# Altium footprint library 430 integreted.PcbLib: 281 footprints (part 10 of 18)
Each footprint in its own frame and in the unit in brackets; x right, y up, seen from the top. Pads: shape width x height; smd on the part's side, far side on the other; paste and mask are expansions set on the pad; w line width, h text height; cw(c..) or ccw(c..) is an arc to the next point about the centre after c.
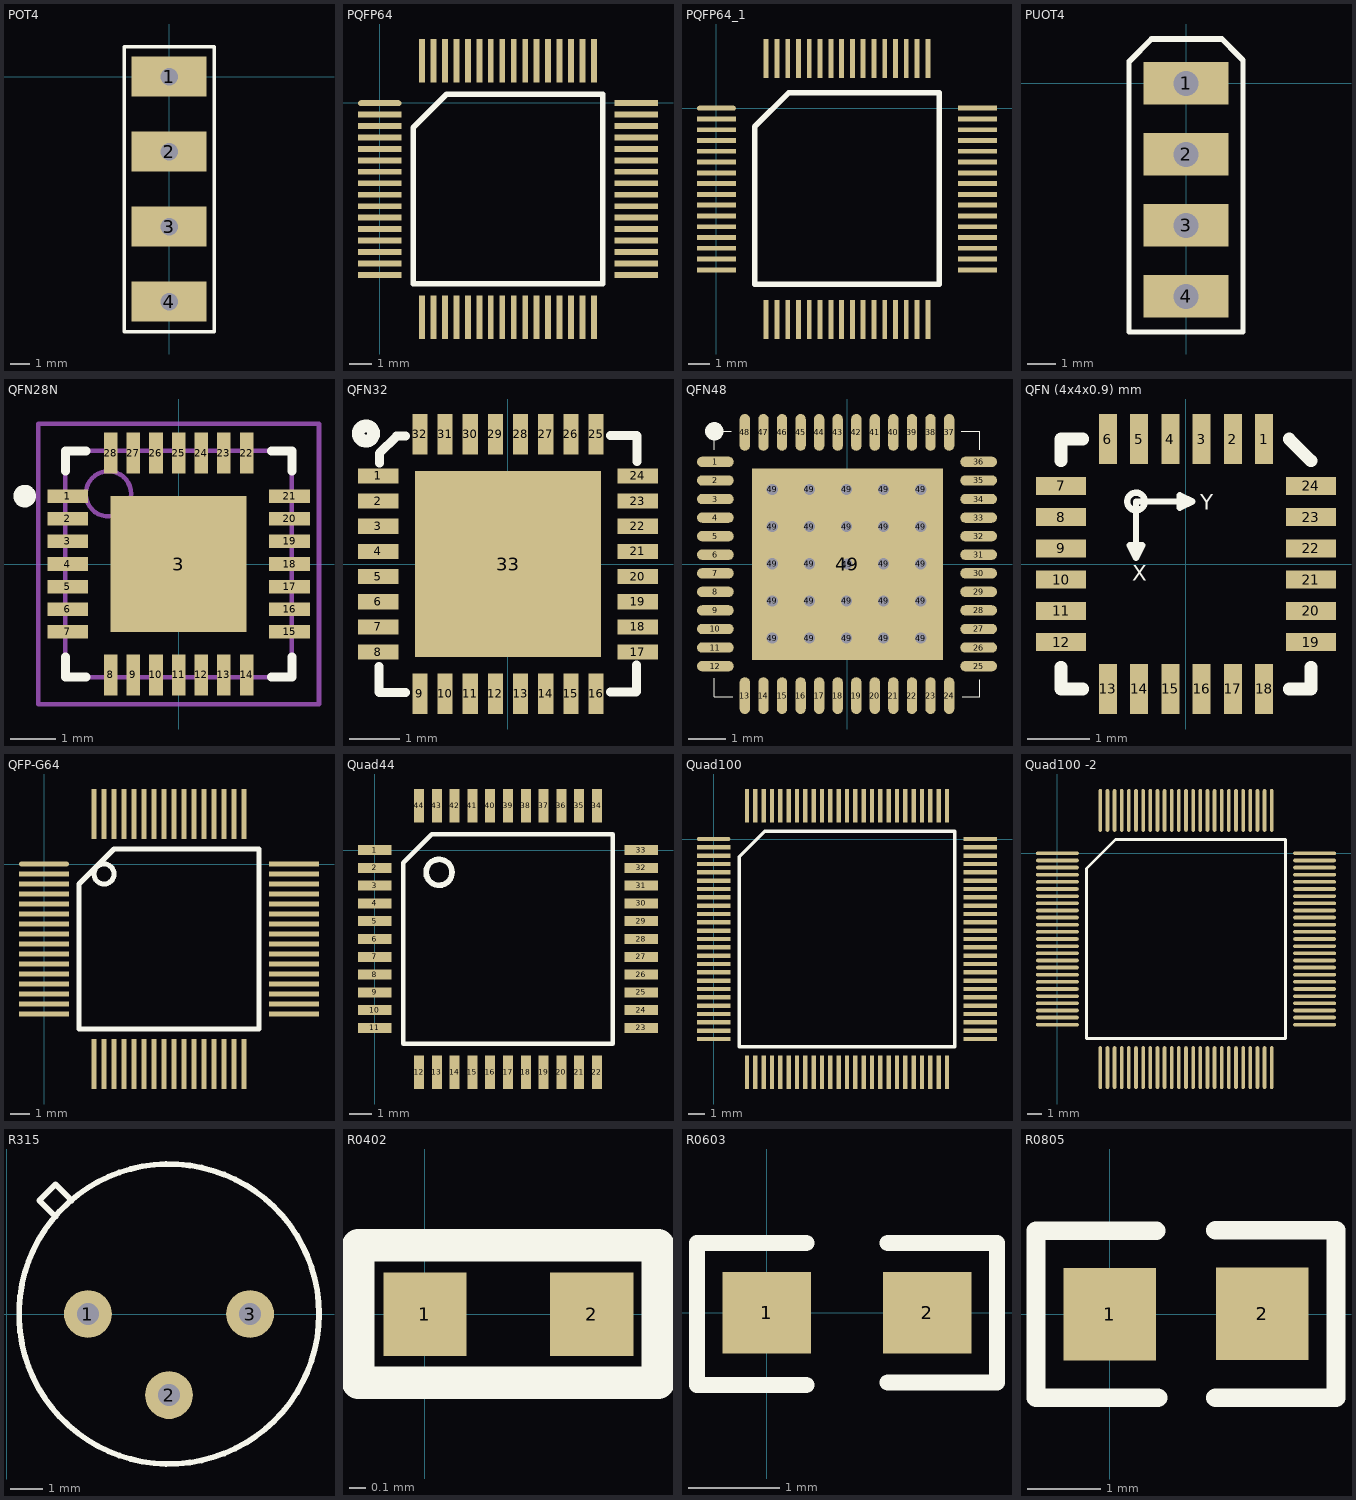
[diagram p9: the footprints below, top view; thin cyan lines are the x and y axes]

## POT4 [mil]
pads (4):
  rect 150x80 hole 35: 1(0,0) 2(0,-150) 3(0,-300) 4(0,-450)
Top Overlay:
  lines w7: -90,-510 -90,60 90,60 90,-510 -90,-510

## PQFP64 [mil]
pads (64):
  oval 74.8x10 smd: 1(-0.07,-0.43)
  rect 74.8x10 smd: 2(-0.07,-20.12) 3(-0.07,-39.8) 4(-0.07,-59.49) 5(-0.07,-79.17) 6(-0.07,-98.86) 7(-0.07,-118.54) 8(-0.07,-138.23) 9(-0.07,-157.91) 10(-0.07,-177.6) 11(-0.07,-197.28) 12(-0.07,-216.97) 13(-0.07,-236.65) 14(-0.07,-256.34) 15(-0.07,-276.02) 16(-0.07,-295.71) 33(440.87,-295.71) 34(440.87,-276.02) 35(440.87,-256.34) 36(440.87,-236.65) 37(440.87,-216.97) 38(440.87,-197.28) 39(440.87,-177.6) 40(440.87,-157.91) 41(440.87,-138.23) 42(440.87,-118.54) 43(440.87,-98.86) 44(440.87,-79.17) 45(440.87,-59.49) 46(440.87,-39.8) 47(440.87,-20.12) 48(440.87,-0.43)
  rect 10x74.8 smd: 17(72.76,-368.54) 18(92.45,-368.54) 19(112.13,-368.54) 20(131.82,-368.54) 21(151.5,-368.54) 22(171.19,-368.54) 23(190.87,-368.54) 24(210.56,-368.54) 25(230.24,-368.54) 26(249.93,-368.54) 27(269.61,-368.54) 28(289.3,-368.54) 29(308.98,-368.54) 30(328.67,-368.54) 31(348.35,-368.54) 32(368.04,-368.54) 49(368.04,72.4) 50(348.35,72.4) 51(328.67,72.4) 52(308.98,72.4) 53(289.3,72.4) 54(269.61,72.4) 55(249.93,72.4) 56(230.24,72.4) 57(210.56,72.4) 58(190.87,72.4) 59(171.19,72.4) 60(151.5,72.4) 61(131.82,72.4) 62(112.13,72.4) 63(92.45,72.4) 64(72.76,72.4)
Top Overlay:
  lines w9.84: 57.41,-311.06 57.41,-42.56 114.89,14.92 383.39,14.92 383.39,-311.06 57.41,-311.06

## PQFP64_1 [mil]
pads (64):
  oval 71x9 smd: 1(0,0)
  rect 71x9 smd: 2(0,-19.68) 3(0,-39.37) 4(0,-59.05) 5(0,-78.74) 6(0,-98.42) 7(0,-118.11) 8(0,-137.79) 9(0,-157.48) 10(0,-177.16) 11(0,-196.85) 12(0,-216.54) 13(0,-236.22) 14(0,-255.91) 15(0,-275.59) 16(0,-295.28) 33(477.01,-295.28) 34(477.01,-275.59) 35(477.01,-255.91) 36(477.01,-236.22) 37(477.01,-216.54) 38(477.01,-196.85) 39(477.01,-177.16) 40(477.01,-157.48) 41(477.01,-137.79) 42(477.01,-118.11) 43(477.01,-98.42) 44(477.01,-78.74) 45(477.01,-59.05) 46(477.01,-39.37) 47(477.01,-19.68) 48(477.01,0)
  rect 9x71 smd: 17(90.87,-386.14) 18(110.55,-386.14) 19(130.24,-386.14) 20(149.92,-386.14) 21(169.61,-386.14) 22(189.29,-386.14) 23(208.98,-386.14) 24(228.66,-386.14) 25(248.35,-386.14) 26(268.03,-386.14) 27(287.72,-386.14) 28(307.4,-386.14) 29(327.09,-386.14) 30(346.77,-386.14) 31(366.46,-386.14) 32(386.14,-386.14) 49(386.14,90.87) 50(366.46,90.87) 51(346.77,90.87) 52(327.09,90.87) 53(307.4,90.87) 54(287.72,90.87) 55(268.03,90.87) 56(248.35,90.87) 57(228.66,90.87) 58(208.98,90.87) 59(189.29,90.87) 60(169.61,90.87) 61(149.92,90.87) 62(130.24,90.87) 63(110.55,90.87) 64(90.87,90.87)
Top Overlay:
  lines w10: 70,-321.85 407.01,-321.85 407.01,28.15 132.01,28.15 70,-33.86 70,-321.85

## PUOT4 [mil]
pads (4):
  rect 120x60 hole 35: 1(0,0) 2(0,-100) 3(0,-200) 4(0,-300)
Top Overlay:
  lines w7: -80,31 -80,-350 80,-350 80,33
  lines w8: -80,31 -48.5,62.5 50.5,62.5 72.62,40.38 80,33

## QFN28N [mm] "QFN, 28-Leads, Body 5.0x5.0mm (max), Pitch 0.50mm, IPC Medium Density"
height 0.8
pads (37):
  rect 0.9x0.3 smd: 1(-2.45,1.5) 2(-2.45,1) 3(-2.45,0.5) 4(-2.45,0) 5(-2.45,-0.5) 6(-2.45,-1) 7(-2.45,-1.5) 15(2.45,-1.5) 16(2.45,-1) 17(2.45,-0.5) 18(2.45,0) 19(2.45,0.5) 20(2.45,1) 21(2.45,1.5)
  rect 3x3 smd: 3(0,0)
  rect 0.3x0.9 smd: 8(-1.5,-2.45) 9(-1,-2.45) 10(-0.5,-2.45) 11(0,-2.45) 12(0.5,-2.45) 13(1,-2.45) 14(1.5,-2.45) 22(1.5,2.45) 23(1,2.45) 24(0.5,2.45) 25(0,2.45) 26(-0.5,2.45) 27(-1,2.45) 28(-1.5,2.45)
  rect 0x0 smd: 29(-0.85,0) 30(-0.35,0) 31(0,0.85) 32(0,0.35) 33(0.85,0) 34(0.35,0) 35(0,-0.85) 36(0,-0.35)
Top Overlay:
  circle w0.25: c-3.4,1.5 r0.125
  lines w0.2: -2.5,-2.05 -2.5,-2.5 -2.05,-2.5 ; -2.5,2.05 -2.5,2.5 -2.05,2.5 ; 2.05,-2.5 2.5,-2.5 2.5,-2.05 ; 2.05,2.5 2.5,2.5 2.5,2.05
Mechanical 13:
  circle w0.1: c-1.55,1.55 r0.5
  lines w0.1: -2.5,-2.5 2.5,-2.5 2.5,2.5 -2.5,2.5 -2.5,-2.5
Mechanical 15:
  lines w0.1: -0.5,0 0.5,0 ; 0,-0.5 0,0.5 ; -3.1,-3.1 3.1,-3.1 3.1,3.1 -3.1,3.1 -3.1,-3.1
3D body: height 0.8, standoff 0.02, extent -2.5,-2.5 2.5,2.5

## QFN32 [mm]
pads (33):
  rect 0.8x0.3 smd: 1(-2.578,1.751) 2(-2.578,1.25) 3(-2.578,0.75) 4(-2.578,0.25) 5(-2.578,-0.25) 6(-2.578,-0.75) 7(-2.578,-1.25) 8(-2.578,-1.75) 17(2.578,-1.75) 18(2.578,-1.25) 19(2.578,-0.75) 20(2.578,-0.25) 21(2.578,0.25) 22(2.578,0.75) 23(2.578,1.25) 24(2.578,1.75)
  rect 0.3x0.8 smd: 9(-1.75,-2.578) 10(-1.25,-2.578) 11(-0.75,-2.578) 12(-0.25,-2.578) 13(0.25,-2.578) 14(0.75,-2.578) 15(1.25,-2.578) 16(1.75,-2.578) 25(1.75,2.578) 26(1.25,2.578) 27(0.75,2.578) 28(0.25,2.578) 29(-0.25,2.578) 30(-0.75,2.578) 31(-1.25,2.578) 32(-1.75,2.578)
  rect 3.7x3.7 smd: 33(0,0)
Top Overlay:
  circle w0.254: c-2.819,2.591 r0.152
  lines w0.178: -2.565,-2.032 -2.565,-2.54 -2.553,-2.553 -2.032,-2.553 ; -2.553,2.007 -2.553,2.197 -2.21,2.54 -2.032,2.54 ; 2.032,-2.54 2.54,-2.54 2.553,-2.527 2.553,-2.007 ; 2.032,2.553 2.553,2.553 2.565,2.54 2.565,2.032
3D body: height 0.8, standoff 0, extent -2.494,-2.51 2.526,2.51

## QFN48 [mm]
pads (74):
  oval 0.99x0.28 smd: 1(-3.545,2.75) 2(-3.545,2.25) 3(-3.545,1.75) 4(-3.545,1.25) 5(-3.545,0.75) 6(-3.545,0.25) 7(-3.545,-0.25) 8(-3.545,-0.75) 9(-3.545,-1.25) 10(-3.545,-1.75) 11(-3.545,-2.25) 12(-3.545,-2.75) 25(3.545,-2.75) 26(3.545,-2.25) 27(3.545,-1.75) 28(3.545,-1.25) 29(3.545,-0.75) 30(3.545,-0.25) 31(3.545,0.25) 32(3.545,0.75) 33(3.545,1.25) 34(3.545,1.75) 35(3.545,2.25) 36(3.545,2.75)
  oval 0.28x0.99 smd: 13(-2.75,-3.545) 14(-2.25,-3.545) 15(-1.75,-3.545) 16(-1.25,-3.545) 17(-0.75,-3.545) 18(-0.25,-3.545) 19(0.25,-3.545) 20(0.75,-3.545) 21(1.25,-3.545) 22(1.75,-3.545) 23(2.25,-3.545) 24(2.75,-3.545) 37(2.75,3.545) 38(2.25,3.545) 39(1.75,3.545) 40(1.25,3.545) 41(0.75,3.545) 42(0.25,3.545) 43(-0.25,3.545) 44(-0.75,3.545) 45(-1.25,3.545) 46(-1.75,3.545) 47(-2.25,3.545) 48(-2.75,3.545)
  round 0.35 hole 0.3: 49(-2.013,-1.993) 49(-2.013,-0.993) 49(-2.013,0.007) 49(-2.013,1.007) 49(-2.013,2.007) 49(-1.013,-1.993) 49(-1.013,-0.993) 49(-1.013,0.007) 49(-1.013,1.007) 49(-1.013,2.007) 49(-0.013,-1.993) 49(-0.013,-0.993) 49(-0.013,1.007) 49(-0.013,2.007) 49(0,0) 49(0.987,-1.993) 49(0.987,-0.993) 49(0.987,0.007) 49(0.987,1.007) 49(0.987,2.007) 49(1.987,-1.993) 49(1.987,-0.993) 49(1.987,0.007) 49(1.987,1.007) 49(1.987,2.007)
  rect 5.15x5.15 smd: 49(0.013,-0.007)
Top Overlay:
  circle w0.254: c-3.575,3.575 r0.12
  lines w0.025: -3.575,-3.073 -3.575,-3.575 -3.073,-3.575 ; -3.575,3.073 -3.575,3.575 -3.124,3.575 ; 3.073,3.575 3.575,3.575 3.575,3.079 ; 3.099,-3.575 3.575,-3.575 3.575,-3.124
3D body: height 1, standoff 0.08, extent -3.5,-3.5 3.5,3.5

## QFN (4x4x0.9) mm [mm]
pads (24):
  rect 0.29x0.8 smd: 1(1.25,2) 2(0.75,2) 3(0.25,2) 4(-0.25,2) 5(-0.75,2) 6(-1.25,2) 13(-1.25,-2) 14(-0.75,-2) 15(-0.25,-2) 16(0.25,-2) 17(0.75,-2) 18(1.25,-2)
  rect 0.8x0.29 smd: 7(-2,1.25) 8(-2,0.75) 9(-2,0.25) 10(-2,-0.25) 11(-2,-0.75) 12(-2,-1.25) 19(2,-1.25) 20(2,-0.75) 21(2,-0.25) 22(2,0.25) 23(2,0.75) 24(2,1.25)
Top Overlay:
  circle w0.1: c-0.8,1 r0.141
  lines w0.1: -0.8,0.1 -0.8,1 0.1,1 ; -0.8,0.1 -0.9,0.3 -0.7,0.3 -0.8,0.1 ; 0.1,1 -0.1,1.1 -0.1,0.9 0.1,1
  lines w0.203: -2,-1.65 -2,-2 -1.65,-2 ; -2,1.65 -2,2 -1.65,2 ; 1.65,-2 2,-2 2,-1.65 ; 1.65,2 2,1.65
  text "Y" at 0.231,0.872 h0.25
  text "X" at -0.861,-0.271 h0.25
3D body: height 0.9, standoff 0, extent -1.986,-2.045 2.018,1.959

## QFP-G64 [mil]
pads (64):
  oval 100x10 smd: 1(0,0)
  rect 100x10 smd: 2(0,-20) 3(0,-40) 4(0,-60) 5(0,-80) 6(0,-100) 7(0,-120) 8(0,-140) 9(0,-160) 10(0,-180) 11(0,-200) 12(0,-220) 13(0,-240) 14(0,-260) 15(0,-280) 16(0,-300) 33(500,-300) 34(500,-280) 35(500,-260) 36(500,-240) 37(500,-220) 38(500,-200) 39(500,-180) 40(500,-160) 41(500,-140) 42(500,-120) 43(500,-100) 44(500,-80) 45(500,-60) 46(500,-40) 47(500,-20) 48(500,0)
  rect 10x100 smd: 17(100,-400) 18(120,-400) 19(140,-400) 20(160,-400) 21(180,-400) 22(200,-400) 23(220,-400) 24(240,-400) 25(260,-400) 26(280,-400) 27(300,-400) 28(320,-400) 29(340,-400) 30(360,-400) 31(380,-400) 32(400,-400) 49(400,100) 50(380,100) 51(360,100) 52(340,100) 53(320,100) 54(300,100) 55(280,100) 56(260,100) 57(240,100) 58(220,100) 59(200,100) 60(180,100) 61(160,100) 62(140,100) 63(120,100) 64(100,100)
Top Overlay:
  circle w10: c120,-20 r20
  lines w10: 70,-330 430,-330 430,30 140,30 70,-40 70,-330

## Quad44 [mm]
pads (44):
  rect 1.5x0.45 smd: 1(0,0) 2(0,-0.8) 3(0,-1.6) 4(0,-2.4) 5(0,-3.2) 6(0,-4) 7(0,-4.8) 8(0,-5.6) 9(0,-6.4) 10(0,-7.2) 11(0,-8) 23(12,-8) 24(12,-7.2) 25(12,-6.4) 26(12,-5.6) 27(12,-4.8) 28(12,-4) 29(12,-3.2) 30(12,-2.4) 31(12,-1.6) 32(12,-0.8) 33(12,0)
  rect 0.45x1.5 smd: 12(2,-10) 13(2.8,-10) 14(3.6,-10) 15(4.4,-10) 16(5.2,-10) 17(6,-10) 18(6.8,-10) 19(7.6,-10) 20(8.4,-10) 21(9.2,-10) 22(10,-10) 34(10,2) 35(9.2,2) 36(8.4,2) 37(7.6,2) 38(6.8,2) 39(6,2) 40(5.2,2) 41(4.4,2) 42(3.6,2) 43(2.8,2) 44(2,2)
Top Overlay:
  circle w0.254: c2.9,-1 r0.583
  lines w0.2: 1.285,-8.715 1.285,-0.57 2.57,0.715 10.715,0.715 10.715,-8.715 1.285,-8.715

## Quad100 [mm]
pads (100):
  oval 2x0.26 smd: 1(0,0)
  rect 2x0.26 smd: 2(0,-0.5) 3(0,-1) 4(0,-1.5) 5(0,-2) 6(0,-2.5) 7(0,-3) 8(0,-3.5) 9(0,-4) 10(0,-4.5) 11(0,-5) 12(0,-5.5) 13(0,-6) 14(0,-6.5) 15(0,-7) 16(0,-7.5) 17(0,-8) 18(0,-8.5) 19(0,-9) 20(0,-9.5) 21(0,-10) 22(0,-10.5) 23(0,-11) 24(0,-11.5) 25(0,-12) 51(16,-12) 52(16,-11.5) 53(16,-11) 54(16,-10.5) 55(16,-10) 56(16,-9.5) 57(16,-9) 58(16,-8.5) 59(16,-8) 60(16,-7.5) 61(16,-7) 62(16,-6.5) 63(16,-6) 64(16,-5.5) 65(16,-5) 66(16,-4.5) 67(16,-4) 68(16,-3.5) 69(16,-3) 70(16,-2.5) 71(16,-2) 72(16,-1.5) 73(16,-1) 74(16,-0.5) 75(16,0)
  rect 0.26x2 smd: 26(2,-14) 27(2.5,-14) 28(3,-14) 29(3.5,-14) 30(4,-14) 31(4.5,-14) 32(5,-14) 33(5.5,-14) 34(6,-14) 35(6.5,-14) 36(7,-14) 37(7.5,-14) 38(8,-14) 39(8.5,-14) 40(9,-14) 41(9.5,-14) 42(10,-14) 43(10.5,-14) 44(11,-14) 45(11.5,-14) 46(12,-14) 47(12.5,-14) 48(13,-14) 49(13.5,-14) 50(14,-14) 76(14,2) 77(13.5,2) 78(13,2) 79(12.5,2) 80(12,2) 81(11.5,2) 82(11,2) 83(10.5,2) 84(10,2) 85(9.5,2) 86(9,2) 87(8.5,2) 88(8,2) 89(7.5,2) 90(7,2) 91(6.5,2) 92(6,2) 93(5.5,2) 94(5,2) 95(4.5,2) 96(4,2) 97(3.5,2) 98(3,2) 99(2.5,2) 100(2,2)
Top Overlay:
  lines w0.2: 1.535,-12.465 14.465,-12.465 14.465,0.465 3.07,0.465 1.535,-1.07 1.535,-12.465

## Quad100 -2 [mm]
pads (100):
  oval 3x0.26 smd: 1(0,0) 2(0,-0.5) 3(0,-1) 4(0,-1.5) 5(0,-2) 6(0,-2.5) 7(0,-3) 8(0,-3.5) 9(0,-4) 10(0,-4.5) 11(0,-5) 12(0,-5.5) 13(0,-6) 14(0,-6.5) 15(0,-7) 16(0,-7.5) 17(0,-8) 18(0,-8.5) 19(0,-9) 20(0,-9.5) 21(0,-10) 22(0,-10.5) 23(0,-11) 24(0,-11.5) 25(0,-12) 51(18,-12) 52(18,-11.5) 53(18,-11) 54(18,-10.5) 55(18,-10) 56(18,-9.5) 57(18,-9) 58(18,-8.5) 59(18,-8) 60(18,-7.5) 61(18,-7) 62(18,-6.5) 63(18,-6) 64(18,-5.5) 65(18,-5) 66(18,-4.5) 67(18,-4) 68(18,-3.5) 69(18,-3) 70(18,-2.5) 71(18,-2) 72(18,-1.5) 73(18,-1) 74(18,-0.5) 75(18,0)
  oval 0.26x3 smd: 26(3,-15) 27(3.5,-15) 28(4,-15) 29(4.5,-15) 30(5,-15) 31(5.5,-15) 32(6,-15) 33(6.5,-15) 34(7,-15) 35(7.5,-15) 36(8,-15) 37(8.5,-15) 38(9,-15) 39(9.5,-15) 40(10,-15) 41(10.5,-15) 42(11,-15) 43(11.5,-15) 44(12,-15) 45(12.5,-15) 46(13,-15) 47(13.5,-15) 48(14,-15) 49(14.5,-15) 50(15,-15) 76(15,3) 77(14.5,3) 78(14,3) 79(13.5,3) 80(13,3) 81(12.5,3) 82(12,3) 83(11.5,3) 84(11,3) 85(10.5,3) 86(10,3) 87(9.5,3) 88(9,3) 89(8.5,3) 90(8,3) 91(7.5,3) 92(7,3) 93(6.5,3) 94(6,3) 95(5.5,3) 96(5,3) 97(4.5,3) 98(4,3) 99(3.5,3) 100(3,3)
Top Overlay:
  lines w0.2: 2.035,-12.965 2.035,-1.07 4.07,0.965 15.965,0.965 15.965,-12.965 2.035,-12.965
3D body: height 1.6, standoff 0, extent 0.991,-13.969 16.991,2.031

## R315 [mm]
pads (3):
  round 1.5 hole 0.7: 1(2.54,0) 2(5.08,-2.54) 3(7.62,0)
Top Overlay:
  circle w0.178: c5.08,0 r4.7
  lines w0.178: 1.524,3.048 1.016,3.556 1.524,4.064 2.032,3.556

## R0402 [mil]
pads (2):
  rect 20x20 smd: 1(0,0) 2(40,0)
Top Overlay:
  lines w7.87: -16.07,-16.42 -16.07,16.58 55.93,16.58 55.93,-16.42 -16.07,-16.42
3D body: height 13.78, standoff 0, extent 0.34,-10.02 39.71,9.67

## R0603 [mil]
pads (2):
  rect 38x35 smd: 1(0,0) 2(69,0)
Top Overlay:
  lines w7: 17,-31 -30,-31 -30,30 17,30 ; 52,-30 99,-30 99,30 52,30
3D body: height 17.72, standoff 0, extent 3.51,-15.74 66.5,15.75

## R0805 [mm]
pads (2):
  rect 1.27x1.27 smd: 1(0,0) 2(2.09,0.005)
Top Overlay:
  lines w0.254: 0.635,1.143 -1.011,1.143 -1.011,-1.143 0.66,-1.143 ; 1.448,-1.143 3.099,-1.143 3.099,1.148 1.448,1.148
3D body: height 0.55, standoff 0, extent 0.036,-0.62 2.036,0.64